# Altium footprint library CryptLib.PcbLib: 52 footprints (part 1 of 4)
Each footprint in its own frame and in the unit in brackets; x right, y up, seen from the top. Pads: shape width x height; smd on the part's side, far side on the other; paste and mask are expansions set on the pad; w line width, h text height; cw(c..) or ccw(c..) is an arc to the next point about the centre after c.
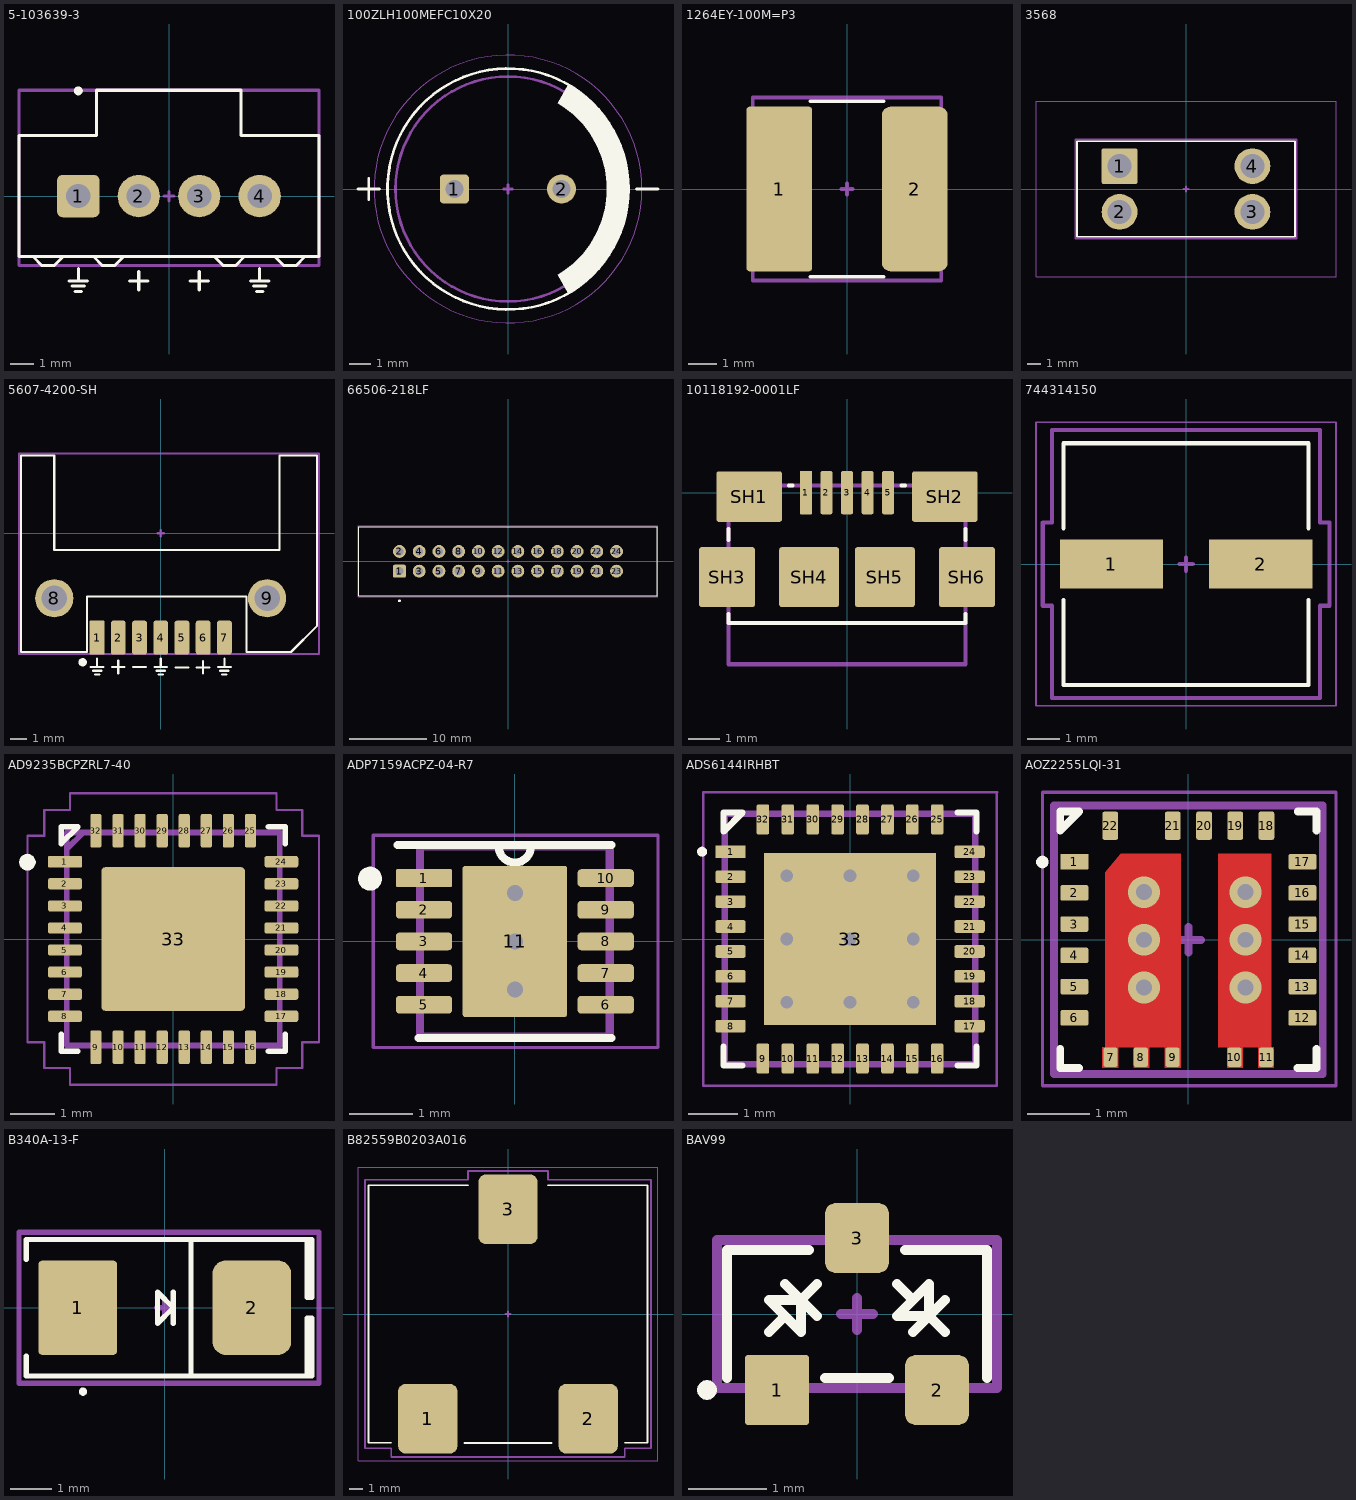
[diagram p0: the footprints below, top view; thin cyan lines are the x and y axes]

## 5-103639-3 [mil]
pads (6):
  rrect25% 70x70 hole 40: 1(-150,0)
  round 70 hole 40: 2(-50,0) 3(50,0) 4(150,0)
  round 7.5 on Mech8: ""(-150,0)
  round 15 on Top Overlay: ""(-150,174)
Top Overlay:
  lines w5: -225,-100 -210,-115 -190,-115 -175,-100 ; -165,-140 -135,-140 ; -160,-149 -140,-149 ; -155,-158 -145,-158 ; -150,-140 -150,-120 ; -125,-100 -110,-115 -90,-115 -75,-100 ; -65,-140 -35,-140 ; -50,-155 -50,-125 ; 35,-140 65,-140 ; 50,-155 50,-125 ; 75,-100 90,-115 110,-115 125,-100 ; 135,-140 165,-140 ; 140,-149 160,-149 ; 145,-158 155,-158 ; 150,-140 150,-120 ; 175,-100 190,-115 210,-115 225,-100 ; -248,-100 -248,100 -120,100 -120,175 119,175 119,100 248,100 248,-100 -248,-100
Top Designator:
  text "'.Designator'" at -113.3,-8.33 h20
Top Assembly:
  lines w5: -8,0 8,0 ; 0,-8 0,8 ; -248,-115 -248,175 248,175 248,-115 -248,-115
3D body "5-103639-3.stp": height 535.54, standoff -129.42, extent -247.43,-114.95 247.45,159.85

## 100ZLH100MEFC10X20 [mil] "Can Electrolytic Capacitor"
height 875
pads (3):
  rrect25% 54x54 hole 34: 1(-100,0)
  round 54 hole 34: 2(100,0)
  round 7.5 on Mech8: ""(-100,0)
Top Overlay:
  circle w5: c0,0 r225
  region: 92.5,-160.21 102.78,-153.82 121.98,-139.09 139.09,-121.98 153.82,-102.78 165.92,-81.82 175.18,-59.47 181.45,-36.09 184.6,-12.1 184.6,12.1 181.45,36.09 175.18,59.47 165.92,81.82 153.82,102.78 139.09,121.98 121.98,139.09 102.78,153.82 92.5,160.21 112.5,194.86 125.27,187.48 148.67,169.53 169.53,148.67 187.48,125.27 202.23,99.73 213.52,72.48 221.15,43.99 225,14.75 225,-14.75 221.15,-43.99 213.52,-72.48 202.23,-99.73 187.48,-125.27 169.53,-148.67 148.67,-169.53 125.27,-187.48 112.5,-194.86
  lines w5: -280,0 -240,0 ; -260,-20 -260,20 ; 240,0 280,0
Top Designator:
  text "'.Designator'" at -113.3,-8.33 h20
Top Assembly:
  circle w5: c0,0 r210
  lines w5: -8,0 8,0 ; 0,-8 0,8
Top Courtyard (Mech10):
  circle w2: c0,0 r250
3D body "CAP_YX_10X20_RUB.step": height 866.61, standoff -172.01, extent -206.5,-206.5 207.45,206.5

## 1264EY-100M=P3 [mil]
pads (3):
  rrect10% 90x225 smd: 1(-92.52,0)
  rrect25% 90x225 smd: 2(92.52,0)
  round 7.5 on Mech8: ""(-92.52,0)
Top Overlay:
  lines w5: -50,-120 50,-120 ; -50,120 50,120
Top Designator:
  text "'.Designator'" at -113.3,-8.33 h20
Top Assembly:
  lines w5: -8,0 8,0 ; 0,-8 0,8 ; -129,-125 -129,125 129,125 129,-125 -129,-125
3D body "1264EY-100M=P3.STEP": height 197.35, standoff 0.5, extent -118.11,-118.1 118.11,118.12

## 3568 [mil] "Keystone Fuse Holder"
height 300
pads (5):
  rrect10% 105x105 hole 70: 1(-195,67)
  round 105 hole 70: 2(-195,-67) 3(195,-67) 4(195,67)
  round 7.5 on Mech8: ""(-195,67)
Top Overlay:
  lines w5: -320,-140 320,-140 320,140 -320,140 -320,-140
Top Designator:
  text "'.Designator'" at -113.3,-8.33 h20
Top Assembly:
  lines w5: -8,0 8,0 ; 0,-8 0,8 ; -325,-145 -325,145 325,145 325,-145 -325,-145
Top Courtyard (Mech10):
  lines w2: -440,-257.5 -440,257.5 440,257.5 440,-257.5 -440,-257.5
3D body "Fuse_Keystone_3568_eec.STEP": height 294.73, standoff -105.27, extent -314.96,-133.24 314.96,131.72

## 5607-4200-SH [mil]
pads (11):
  rrect10% 35x80 smd: 1(-150,-246)
  rrect33% 35x80 smd: 2(-100,-246) 3(-50,-246) 4(0,-246) 5(50,-246) 6(100,-246) 7(150,-246)
  round 90 hole 60: 8(-250.79,-153.15) 9(250.79,-153.15)
  round 20 on Top Overlay: ""(-184,-304)
  round 7.5 on Mech8: ""(-150,-246)
Top Overlay:
  lines w5: -165,-315 -135,-315 ; -160,-324 -140,-324 ; -155,-333 -145,-333 ; -150,-315 -150,-295 ; -115,-315 -85,-315 ; -100,-330 -100,-300 ; -65,-315 -35,-315 ; -15,-315 15,-315 ; -10,-324 10,-324 ; -5,-333 5,-333 ; 0,-315 0,-295 ; 35,-316 65,-316 ; 85,-316 115,-316 ; 100,-331 100,-301 ; 135,-315 165,-315 ; 140,-324 160,-324 ; 145,-333 155,-333 ; 150,-315 150,-295 ; -328.86,-279.92 -328.86,183 -250.91,183 -250.91,-39.76 280.2,-39.76 280.2,183 368,183 368,-219 307.08,-279.92 202.44,-279.92 202.44,-148.82 -174,-148.82 -174,-279.92 -328.86,-279.92
Top Designator:
  text "'.Designator'" at -113.3,-8.33 h20
Top Assembly:
  lines w5: -8,0 8,0 ; 0,-8 0,8 ; -334,-285 373,-285 373,188 -334,188 -334,-285
3D body "5607-4200-SH-01.stp": height 157.98, standoff -105.8, extent -327.9,-278 359.9,174.76

## 66506-218LF [mil]
pads (26):
  rrect25% 65x65 hole 40: 1(-550,-50)
  round 65 hole 40: 2(-550,50) 3(-450,-50) 4(-450,50) 5(-350,-50) 6(-350,50) 7(-250,-50) 8(-250,50) 9(-150,-50) 10(-150,50) 11(-50,-50) 12(-50,50) 13(50,-50) 14(50,50) 15(150,-50) 16(150,50) 17(250,-50) 18(250,50) 19(350,-50) 20(350,50) 21(450,-50) 22(450,50) 23(550,-50) 24(550,50)
  round 15 on Top Overlay: ""(-550,-200)
  round 7.5 on Mech8: ""(-550,-50)
Top Overlay:
  lines w5: -755,-175 -755,175 755,175 755,-175 -755,-175
Top Designator:
  text "'.Designator'" at -113.3,-8.33 h20
Top Assembly:
  lines w5: -8,0 8,0 ; 0,-8 0,8 ; -760,-180 -760,180 760,180 760,-180 -760,-180
3D body "66506-218LFc.stp": height 365.5, standoff -104.5, extent -739.99,-159.99 740.01,160.01

## 0297010.WXNV [mil] "10A Fuse WITHOUT HOLDER"
3D body "Fuse_Littelfuse_0297010_WXNV_eec.STEP": height 641.77, standoff 0, extent -214.57,-77.55 214.57,70.45

## 10118192-0001LF [mil]
pads (12):
  rrect10% 15x54 smd: 1(-51.18,0)
  rrect33% 15x54 smd: 2(-25.59,0) 3(0,0) 4(25.59,0) 5(51.18,0)
  rrect10% 82x63 smd: SH1(-122.05,-4.92) SH2(122.05,-4.92)
  rrect10% 70x75 smd: SH3(-149.61,-105.31) SH6(149.61,-105.31)
  rrect10% 75x75 smd: SH4(-47.24,-105.31) SH5(47.24,-105.31)
  round 7.5 on Mech8: ""(-51.18,0)
Top Overlay:
  lines w5: -147.64,-151.57 -147.64,-162.4 147.64,-162.4 147.64,-151.57 ; -147.64,-59.06 -147.64,-45.28 ; -72.05,8.86 -67.72,8.86 ; 67.72,8.86 72.05,8.86 ; 147.64,-59.06 147.64,-45.28
Top Designator:
  text "'.Designator'" at -113.3,-8.33 h20
Top Assembly:
  lines w5: -147.64,-162.4 147.64,-162.4 ; -147.64,-162.4 -147.64,8.86 147.64,8.86 147.64,-162.4 ; -147.64,-162.4 -147.64,-214.02 147.64,-214.02 147.64,-162.4
3D body "10118192-0001LF--3DModel-STEP-56544.STEP": height 106.8, standoff -10.13, extent -155.51,-215 155.51,6.26

## 744314150 [mil]
height 200
pads (3):
  rect 124x59 smd: 1(-89.5,0) 2(89.5,0)
  round 7.5 on Mech8: ""(-89.5,0)
Top Overlay:
  lines w5: -147,-43 -147,-145 147,-145 147,-43 ; -147,43 -147,145 147,145 147,43
Top Designator:
  text "'.Designator'" at -113.3,-8.33 h20
Top Assembly:
  lines w5: -8,0 8,0 ; 0,-8 0,8 ; -172,-50 -161,-50 -161,-161 161,-161 161,-50 172,-50 172,50 161,50 161,161 -161,161 -161,50 -172,50 -172,-50
Top Courtyard (Mech10):
  lines w2: -180,-170 180,-170 180,170 -180,170 -180,-170
3D body "IND_14150_WRE.step": height 197.01, standoff 0, extent -141.5,-141.5 141.5,141.5

## AD9235BCPZRL7-40 [mil] "QFN-32 (5x5)"
height 32
pads (35):
  rrect10% 30x10 smd: 1(-96.5,68.9)
  rrect33% 30x10 smd: 2(-96.5,49.21) 3(-96.5,29.53) 4(-96.5,9.84) 5(-96.5,-9.84) 6(-96.5,-29.53) 7(-96.5,-49.21) 8(-96.5,-68.9) 17(96.5,-68.9) 18(96.5,-49.21) 19(96.5,-29.53) 20(96.5,-9.84) 21(96.5,9.84) 22(96.5,29.53) 23(96.5,49.21) 24(96.5,68.9)
  rrect33% 10x30 smd: 9(-68.9,-96.5) 10(-49.21,-96.5) 11(-29.53,-96.5) 12(-9.84,-96.5) 13(9.84,-96.5) 14(29.53,-96.5) 15(49.21,-96.5) 16(68.9,-96.5) 25(68.9,96.5) 26(49.21,96.5) 27(29.53,96.5) 28(9.84,96.5) 29(-9.84,96.5) 30(-29.53,96.5) 31(-49.21,96.5) 32(-68.9,96.5)
  rrect5% 128x128 smd paste-99999: 33(0,0)
  round 15 on Top Overlay: ""(-130,68.53)
  round 7.5 on Mech8: ""(-96.5,68.9)
Top Overlay:
  lines w5: -100,-85 -100,-100 -85,-100 ; 85,-100 100,-100 100,-85 ; 85,100 100,100 100,85 ; -100,85 -100,100 -85,100 -100,85
Top Paste:
  region: -3.94,60.06 -60.06,60.06 -60.06,3.94 -3.94,3.94
  region: -3.94,-3.94 -60.06,-3.94 -60.06,-60.06 -3.94,-60.06
  region: 60.06,60.06 3.94,60.06 3.94,3.94 60.06,3.94
  region: 60.06,-3.94 3.94,-3.94 3.94,-60.06 60.06,-60.06
Top Designator:
  text "'.Designator'" at -113.3,-8.33 h20
Top Assembly:
  lines w5: -95,80 -80,95 ; -8,0 8,0 ; 0,-8 0,8 ; -95,-95 95,-95 95,95 -95,95 -95,-95
Top Courtyard (Mech10):
  lines w2: -130,-92 -115,-92 -115,-115 -92,-115 -92,-130 92,-130 92,-115 115,-115 115,-92 130,-92 130,92 115,92 115,115 92,115 92,130 -92,130 -92,115 -115,115 -115,92 -130,92 -130,-92
3D body "CP_32_2_ADI.step": height 39.09, standoff 0, extent -98.5,-98.5 98.5,98.5

## ADP7159ACPZ-04-R7 [mil] "VFDFN-10"
height 30
pads (13):
  rrect15% 35x11 smd: 1(-56.5,39.37)
  rrect40% 35x11 smd: 2(-56.5,19.68) 3(-56.5,0) 4(-56.5,-19.68) 5(-56.5,-39.37) 6(56.5,-39.37) 7(56.5,-19.68) 8(56.5,0) 9(56.5,19.68) 10(56.5,39.37)
  rrect5% 65x94 smd: 11(0,0)
  round 15 on Top Overlay: ""(-90,39)
  round 7.5 on Mech8: ""(-56.5,39.37)
via 0,0 diameter 20 hole 10
via 0,-30 diameter 20 hole 10
via 0,30 diameter 20 hole 10
Top Overlay:
  lines w5: -73,60 60,60 ; -60,-60 60,-60 ; -10,59 ccw(c0,59) 10,59
Top Designator:
  text "'.Designator'" at -113.3,-8.33 h20
Top Assembly:
  lines w5: -8,0 8,0 ; 0,-8 0,8 ; -59,-59 -59,59 59,59 59,-59 -59,-59
Top Courtyard (Mech10):
  lines w2: -88,-66 89,-66 89,66 -88,66 -88,-66
3D body "ADP7159ACPZ-04-R7.STEP": height 33.96, standoff 0.5, extent -59.06,-59.06 59.06,59.06

## ADS6144IRHBT [mil] "VQFN-32 (5x5)"
height 40
pads (35):
  rrect10% 24x10 smd: 1(-94.49,68.9)
  rrect33% 24x10 smd: 2(-94.49,49.21) 3(-94.49,29.53) 4(-94.49,9.84) 5(-94.49,-9.84) 6(-94.49,-29.53) 7(-94.49,-49.21) 8(-94.49,-68.9) 17(94.49,-68.9) 18(94.49,-49.21) 19(94.49,-29.53) 20(94.49,-9.84) 21(94.49,9.84) 22(94.49,29.53) 23(94.49,49.21) 24(94.49,68.9)
  rrect33% 10x24 smd: 9(-68.9,-94.49) 10(-49.21,-94.49) 11(-29.53,-94.49) 12(-9.84,-94.49) 13(9.84,-94.49) 14(29.53,-94.49) 15(49.21,-94.49) 16(68.9,-94.49) 25(68.9,94.49) 26(49.21,94.49) 27(29.53,94.49) 28(9.84,94.49) 29(-9.84,94.49) 30(-29.53,94.49) 31(-49.21,94.49) 32(-68.9,94.49)
  rect 135.83x135.83 smd paste-118.11 mask+0: 33(0,0)
  round 8 on Top Overlay: ""(-117,69)
  round 7.5 on Mech8: ""(-94.49,68.9)
via 0,0 diameter 20 hole 10
via -50,0 diameter 20 hole 10
via 0,-50 diameter 20 hole 10
via 50,0 diameter 20 hole 10
via 0,50 diameter 20 hole 10
via 50,50 diameter 20 hole 10
via -50,50 diameter 20 hole 10
via -50,-50 diameter 20 hole 10
via 50,-50 diameter 20 hole 10
Top Overlay:
  lines w5: -100,-85 -100,-100 -85,-100 ; 85,-100 100,-100 100,-85 ; 85,100 100,100 100,85 ; -100,85 -85,100 -100,100 -100,85
Top Paste:
  region: -3.94,3.94 -62.6,3.94 -62.6,62.6 -3.94,62.6
  region: 62.6,3.94 3.94,3.94 3.94,62.6 62.6,62.6
  region: -3.94,-62.6 -62.6,-62.6 -62.6,-3.94 -3.94,-3.94
  region: 62.6,-62.6 3.94,-62.6 3.94,-3.94 62.6,-3.94
Top Solder:
  drawing of 33 lines, arcs and shapes, not listed
Top Designator:
  text "'.Designator'" at -113.3,-8.33 h20
Top Assembly:
  lines w5: -99,98.43 -99,-99 98.43,-99 ; -98.43,99 99,99 99,-98.43 ; -8,0 8,0 ; 0,-8 0,8
Top Courtyard (Mech10):
  lines w2: -116.14,-116 116,-116 116,116.14 ; -116,-116.14 -116,116 116.14,116
3D body "ADS6144IRHBT.STEP": height 39.87, standoff 0.5, extent -98.43,-98.43 98.43,98.43

## AOZ2255LQI-31 [mm] "PowerVFQFN-22"
height 0.889
pads (24):
  rrect10% 0.45x0.25 smd: 1(-1.825,1.25)
  rrect25% 0.45x0.25 smd: 2(-1.825,0.75) 3(-1.825,0.25) 4(-1.825,-0.25) 5(-1.825,-0.75) 6(-1.825,-1.25) 12(1.825,-1.25) 13(1.825,-0.75) 14(1.825,-0.25) 15(1.825,0.25) 16(1.825,0.75) 17(1.825,1.25)
  rrect25% 0.229x0.305 smd: 7(-1.245,-1.88) 8(-0.762,-1.88) 9(-0.254,-1.88) 10(0.737,-1.88) 11(1.245,-1.88)
  rrect25% 0.25x0.45 smd: 18(1.25,1.825) 19(0.75,1.825) 20(0.25,1.825) 21(-0.25,1.825) 22(-1.25,1.825)
  round 0.203 on Top Overlay: ""(-2.337,1.245)
  round 0.191 on Mech8: ""(-1.825,1.25)
via -0.711,-0.762 diameter 0.508 hole 0.254
via -0.711,0.762 diameter 0.508 hole 0.254
via -0.711,0 diameter 0.508 hole 0.254
via 0.914,-0.762 diameter 0.508 hole 0.254
via 0.914,0.762 diameter 0.508 hole 0.254
via 0.914,0 diameter 0.508 hole 0.254
Top Layer:
  region: -0.125,1.38 -1.08,1.38 -1.33,1.08 -1.33,-1.72 -1.375,-1.72 -1.375,-2.05 -1.125,-2.05 -1.125,-1.72 -0.875,-1.72 -0.875,-2.05 -0.625,-2.05 -0.625,-1.72 -0.375,-1.72 -0.375,-2.05 -0.125,-2.05
  region: 0.475,1.38 0.475,-1.72 0.62,-1.72 0.62,-2.05 0.87,-2.05 0.87,-1.72 1.12,-1.72 1.12,-2.05 1.37,-2.05 1.37,-1.72 1.33,-1.72 1.33,1.38
Top Overlay:
  lines w0.127: -2.05,-1.75 -2.05,-2.05 -1.75,-2.05 ; 1.745,-2.05 2.05,-2.05 2.05,-1.75 ; 1.75,2.05 2.05,2.05 2.05,1.75 ; -2.05,1.75 -2.05,2.05 -1.75,2.05 -2.05,1.75
Top Designator:
  text "'.Designator'" at -2.878,-0.212 h0.51
Top Assembly:
  lines w0.127: -0.203,0 0.203,0 ; 0,-0.203 0,0.203 ; -2.15,-2.15 2.15,-2.15 2.15,2.15 -2.15,2.15 -2.15,-2.15
Top Courtyard (Mech10):
  lines w0.051: -2.337,-2.337 2.362,-2.337 2.362,2.362 -2.337,2.362 -2.337,-2.337
3D body "IC_Alpha_&_Omega_AOZ2255LQI-31_eec.STEP": height 1.05, standoff 0, extent -2,-2 2,2

## B340A-13-F [mil]
pads (4):
  rrect10% 75x90 smd: 1(-83,0)
  rrect33% 75x90 smd: 2(83,0)
  round 7.5 on Mech8: ""(-83,0)
  round 8 on Top Overlay: ""(-78,-80)
Top Overlay:
  lines w5: -132,-46 -132,-65 140,-65 140,-10 135.5,-10 135.5,-65 ; -132,46 -132,65 140,65 140,10 135.5,10 135.5,65 ; 8,-15 8,15 ; 25,-65 25,65 ; -7,-15 -7,15 8,0 -7,-15
Top Designator:
  text "'.Designator'" at -113.3,-8.33 h20
Top Assembly:
  lines w5: -8,0 8,0 ; 0,-8 0,8 ; -139,-72 147,-72 147,72 -139,72 -139,-72
3D body "SMA.STEP": height 94.49, standoff 0, extent -102.36,-54.12 102.37,54.12

## B82559B0203A016 [mil] "Shielded inductor"
height 407
pads (4):
  rrect25% 170x200 smd: 1(-230,-300) 2(230,-300) 3(0,300)
  round 7.5 on Mech8: ""(-230,-300)
Top Overlay:
  lines w5: -335,-369 -400,-369 -400,369 -115,369 ; -125,-370 125,-370 ; 115,369 400,369 400,-369 335,-369
Top Designator:
  text "'.Designator'" at -113.3,-8.33 h20
Top Assembly:
  lines w5: -8,0 8,0 ; 0,-8 0,8 ; -410,-385 -335,-385 -335,-410 335,-410 335,-385 410,-385 410,385 115,385 115,410 -115,410 -115,385 -410,385 -410,-385
Top Courtyard (Mech10):
  lines w2: -430,-420 430,-420 430,420 -430,420 -430,-420
3D body "B82559BxA016_ERU16_10mm_MAX_public_TDK-PC.step": height 407.98, standoff 0.5, extent -340.55,-338.58 340.55,310.24

## BAV99 [mil]
pads (5):
  rrect10% 32x35 smd: 1(-40,-38)
  rrect33% 32x35 smd: 2(40,-38) 3(0,38)
  round 10 on Top Overlay: ""(-75,-38)
  round 7.5 on Mech8: ""(-40,-38)
Top Overlay:
  lines w5: -65,-32 -65,32 -24,32 ; -44,-9 -36,-1 ; -36,15 -28,7 ; -20,-1 -28,7 ; -20,15 -28,7 ; -16,-32 16,-32 ; 20,15 28,7 ; 24,32 65,32 65,-32 ; 28,-9 36,-1 ; 44,-9 36,-1 ; 44,7 36,-1 ; -36,-1 -44,7 -28,7 ; -36,-1 -28,-9 -28,7 ; 28,7 20,-1 36,-1 ; 28,7 36,15 36,-1
Top Designator:
  text "'.Designator'" at -113.3,-8.33 h20
Top Assembly:
  lines w5: -8,0 8,0 ; 0,-8 0,8 ; -70,-37 70,-37 70,37 -70,37 -70,-37
3D body "User Library-sot-3p290x130ll237h100.step": height 39.57, standoff 0, extent -57.09,-46.64 57.08,46.66